# Altium footprint library NDLib.PCBLIB: 499 footprints (part 4 of 32)
Each footprint in its own frame and in the unit in brackets; x right, y up, seen from the top. Pads: shape width x height; smd on the part's side, far side on the other; paste and mask are expansions set on the pad; w line width, h text height; cw(c..) or ccw(c..) is an arc to the next point about the centre after c.
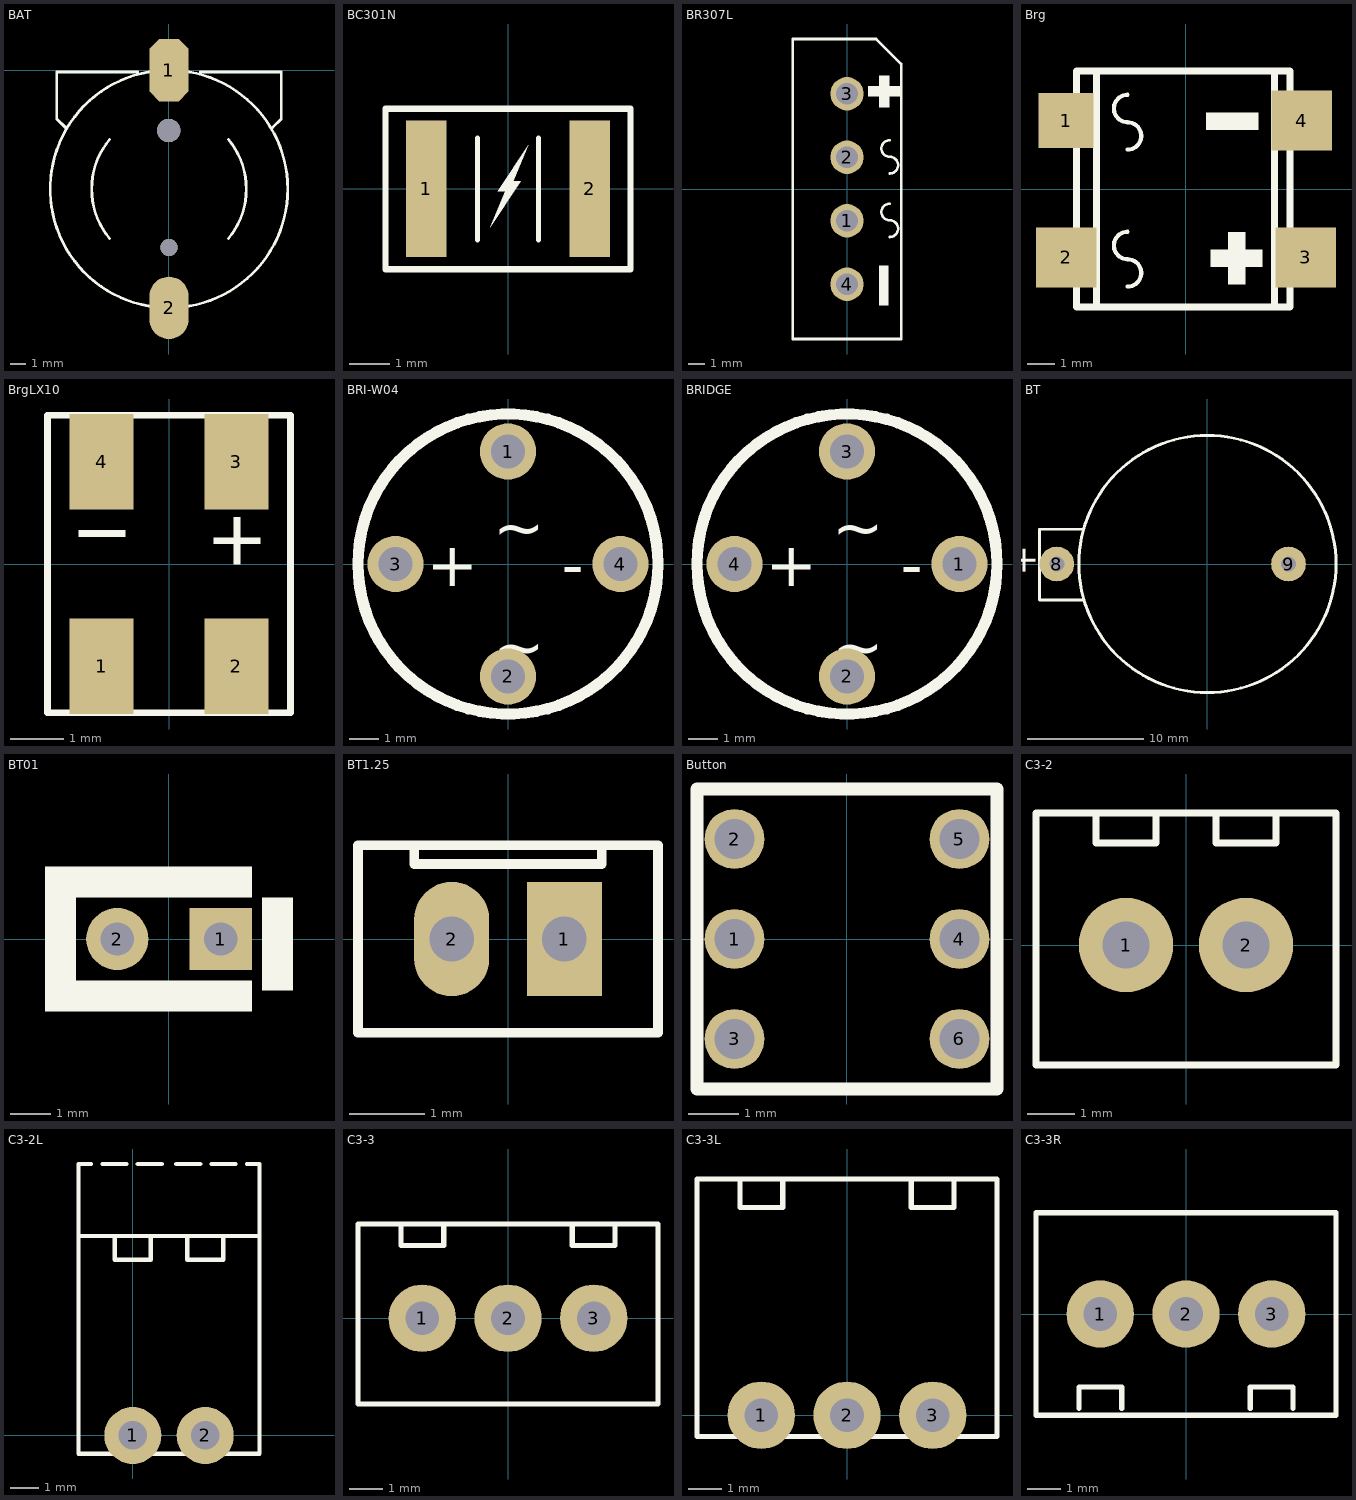
[diagram p3: the footprints below, top view; thin cyan lines are the x and y axes]

## BAT [mm]
pads (4):
  oct 2.5x4 smd: 1(0,0)
  oval 2.5x4 smd: 2(0,-15.24)
  round 1.5 hole 1.5: ""(-0.025,-3.87)
  round 1.1 hole 1.1: ""(0,-11.37)
TopOverlay:
  lines w0.178: -6.625,-3.695 -7.2,-3.12 -7.2,-0.12 -2,-0.12 ; -3.812,-10.792 cw(c0,-7.62) -3.81,-4.445 ; -0.833,-15.194 cw(c0,-7.62) -0.833,-0.046 ; 0.833,-15.194 ccw(c0,-7.62) 7.62,-7.62 ccw(c0,-7.62) 0.833,-0.046 ; 2,-0.12 7.2,-0.12 7.2,-3.12 6.6,-3.72 ; 3.812,-10.792 ccw(c0,-7.62) 3.815,-4.451

## BC301N [mil]
height 78.74
pads (2):
  rect 40x133.86 smd: 1(-80,0) 2(80,0)
TopOverlay:
  region: 20,42.5 -10,-2.5 -2.5,-2.5 -17.5,-37.5 12.5,7.5 5,7.5
  lines w5: -30,-50 -30,50 ; 30,-50 30,50
  lines w6.06: -120,-78.74 120,-78.74 120,78.44 -120,78.44 -120,-78.74
3D body: height 94.49, standoff 0, extent -90.55,-53.14 90.56,53.16

## BR307L [mm]
height 13
pads (4):
  round 2 hole 1.3: 1(0,-1.905) 2(0,1.905) 3(0,5.715) 4(0,-5.715)
TopOverlay:
  region: 3.175,5.54 3.175,6.175 1.27,6.175 1.27,5.54
  rectangle: 1.915,4.9 2.55,6.805
  rectangle: 1.905,-6.985 2.5,-4.6
  lines w0.152: 2.565,-2.88 ccw(c2.565,-2.38) 2.565,-1.88 cw(c2.565,-1.38) 2.565,-0.88 ; 2.565,0.93 ccw(c2.565,1.43) 2.565,1.93 cw(c2.565,2.43) 2.565,2.93 ; -3.25,-9 -3.25,9 1.75,9 3.25,7.5 3.25,-9 -3.25,-9

## Brg [mm]
height 7
pads (4):
  rect 2x2 smd: 1(-4.375,2.5)
  rect 2.2x2.2 smd: 2(-4.375,-2.5) 3(4.375,-2.5) 4(4.225,2.5)
TopOverlay:
  region: 2.794,-2.842 2.794,-2.207 0.889,-2.207 0.889,-2.842
  rectangle: 1.534,-3.482 2.169,-1.577
  region: 2.644,2.158 2.644,2.793 0.739,2.793 0.739,2.158
  lines w0.152: -2.134,-3.562 ccw(c-2.134,-3.062) -2.134,-2.562 cw(c-2.134,-2.062) -2.134,-1.562 ; -2.134,1.438 ccw(c-2.134,1.938) -2.134,2.438 cw(c-2.134,2.938) -2.134,3.438
  lines w0.254: -3.275,-4.3 -3.275,4.3 ; 3.225,-4.3 3.225,4.2 ; -4,-4.3 3.8,-4.3 3.8,4.3 -4,4.3 -4,-4.3
3D body: height 7, standoff 0.5, extent -3.274,-4.299 3.799,4.299

## BrgLX10 [mm]
height 4
pads (4):
  rect 1.2x1.8 smd: 1(-1.27,-1.924) 2(1.27,-1.924) 3(1.27,1.924) 4(-1.27,1.924)
TopOverlay:
  region: -1.704,0.638 -1.704,0.511 -0.815,0.511 -0.815,0.638
  region: 1.727,0.375 1.727,0.502 0.838,0.502 0.838,0.375
  region: 1.346,0.883 1.219,0.883 1.219,-0.006 1.346,-0.006
  lines w0.127: -2.286,-2.8 -2.286,2.8 2.286,2.8 2.286,-2.8 -2.286,-2.8
3D body: height 7, standoff 0.5, extent -1.504,-7.315 5.569,1.283

## BRI-W04 [mil]
pads (4):
  round 75 hole 45: 1(0,150) 2(0,-150) 3(-150,0) 4(150,0)
TopOverlay:
  circle w15: c0,0 r200
  text "~" at -20,-140 h60
  text "+" at -108.51,-29.89 h60
  text "-" at 71.56,-30.37 h60
  text "~" at -20,20 h60

## BRIDGE [mil]
pads (4):
  round 75 hole 45: 1(150,0) 2(0,-150) 3(0,150) 4(-150,0)
TopOverlay:
  circle w15: c0,0 r200
  text "~" at -20,-140 h60
  text "+" at -108.51,-29.89 h60
  text "-" at 71.56,-30.37 h60
  text "~" at -20,20 h60

## BT [mm]
pads (2):
  round 3 hole 1.3: 8(-12.991,0.007) 9(7.009,0.007)
TopOverlay:
  circle w0.254: c0.009,0.007 r11.1
  lines w0.254: -10.791,-3.093 -13.991,-3.093 -14.491,-3.093 -14.491,3.007 -10.791,3.007
  text "+" at -14.791,-0.993 h2.3

## BT01 [mil]
pads (2):
  rect 60x60 hole 32: 1(50,0)
  round 60 hole 32: 2(-50,0)
TopOverlay:
  rectangle: 90,-50 120,40
  region: 80,40 80,70 -100,70 -100,40
  region: -100,-40 -100,-70 80,-70 80,-40
  rectangle: -120,-70 -90,70

## BT1.25 [mm]
height 5
pads (2):
  rect 1x1.524 hole 0.6: 1(0.75,0)
  oval 1x1.524 hole 0.6: 2(-0.75,0)
TopOverlay:
  lines w0.127: -1.25,1.25 -1.25,1 1.25,1 1.25,1.25 ; -2,-1.25 2,-1.25 2,1.25 -2,1.25 -2,-1.25

## Button [mm]
pads (6):
  round 1.2 hole 0.8: 1(-2.25,0) 2(-2.25,2) 3(-2.25,-2) 4(2.25,0) 5(2.25,2) 6(2.25,-2)
TopOverlay:
  lines w0.254: -3,-3 -3,3 3,3 3,-3 -3,-3

## C3-2 [mm]
pads (2):
  round 2 hole 1: 1(-1.27,0) 2(1.27,0)
TopOverlay:
  lines w0.152: -1.905,2.794 -1.905,2.159 -0.635,2.159 -0.635,2.794 ; 0.635,2.794 0.635,2.159 1.905,2.159 1.905,2.794 ; -3.175,-2.54 -3.175,2.794 3.175,2.794 3.175,-2.54 -3.175,-2.54

## C3-2L [mm]
pads (2):
  round 2 hole 1: 1(0,0) 2(2.54,0)
TopOverlay:
  lines w0.152: -1.464,9.523 -1.905,9.523 -1.905,8.682 -1.905,7.841 -1.905,7 ; -1.064,9.523 -0.223,9.523 ; -0.635,7 -0.635,6.159 0.635,6.159 0.635,7 ; 0.177,9.523 1.018,9.523 ; 1.522,9.523 2.363,9.523 ; 1.905,7 1.905,6.159 3.175,6.159 3.175,7 ; 2.763,9.523 3.604,9.523 ; 4.004,9.523 4.445,9.523 4.445,8.682 4.445,7.841 4.445,7 ; -1.905,7 -1.905,-0.635 4.445,-0.635 4.445,7 ; -1.905,7 4.445,7

## C3-3 [mm]
height 10
pads (3):
  round 2 hole 1: 1(-2.54,0) 2(0,0) 3(2.54,0)
TopOverlay:
  lines w0.152: -3.175,2.794 -3.175,2.159 -1.905,2.159 -1.905,2.794 ; 1.905,2.794 1.905,2.159 3.175,2.159 3.175,2.794 ; -4.445,-2.54 4.445,-2.54 4.445,2.794 -4.445,2.794 -4.445,-2.54

## C3-3L [mm]
pads (3):
  round 2 hole 1: 1(-2.54,0) 2(0,0) 3(2.54,0)
TopOverlay:
  lines w0.152: -3.175,7 -3.175,6.159 -1.905,6.159 -1.905,7 ; 1.905,7 1.905,6.159 3.175,6.159 3.175,7 ; -4.445,-0.635 4.445,-0.635 4.445,7 -4.445,7 -4.445,-0.635

## C3-3R [mm]
height 10
pads (3):
  round 2 hole 1: 1(-2.54,0) 2(0,0) 3(2.54,0)
TopOverlay:
  lines w0.152: -3.175,-2.794 -3.175,-2.159 -1.905,-2.159 -1.905,-2.794 ; 1.905,-2.794 1.905,-2.159 3.175,-2.159 3.175,-2.794 ; -4.445,-3 4.445,-3 4.445,3 -4.445,3 -4.445,-3